# Altium footprint library CryptLib.PcbLib: 44 footprints (part 2 of 3)
Each footprint in its own frame and in the unit in brackets; x right, y up, seen from the top. Pads: shape width x height; smd on the part's side, far side on the other; paste and mask are expansions set on the pad; w line width, h text height; cw(c..) or ccw(c..) is an arc to the next point about the centre after c.
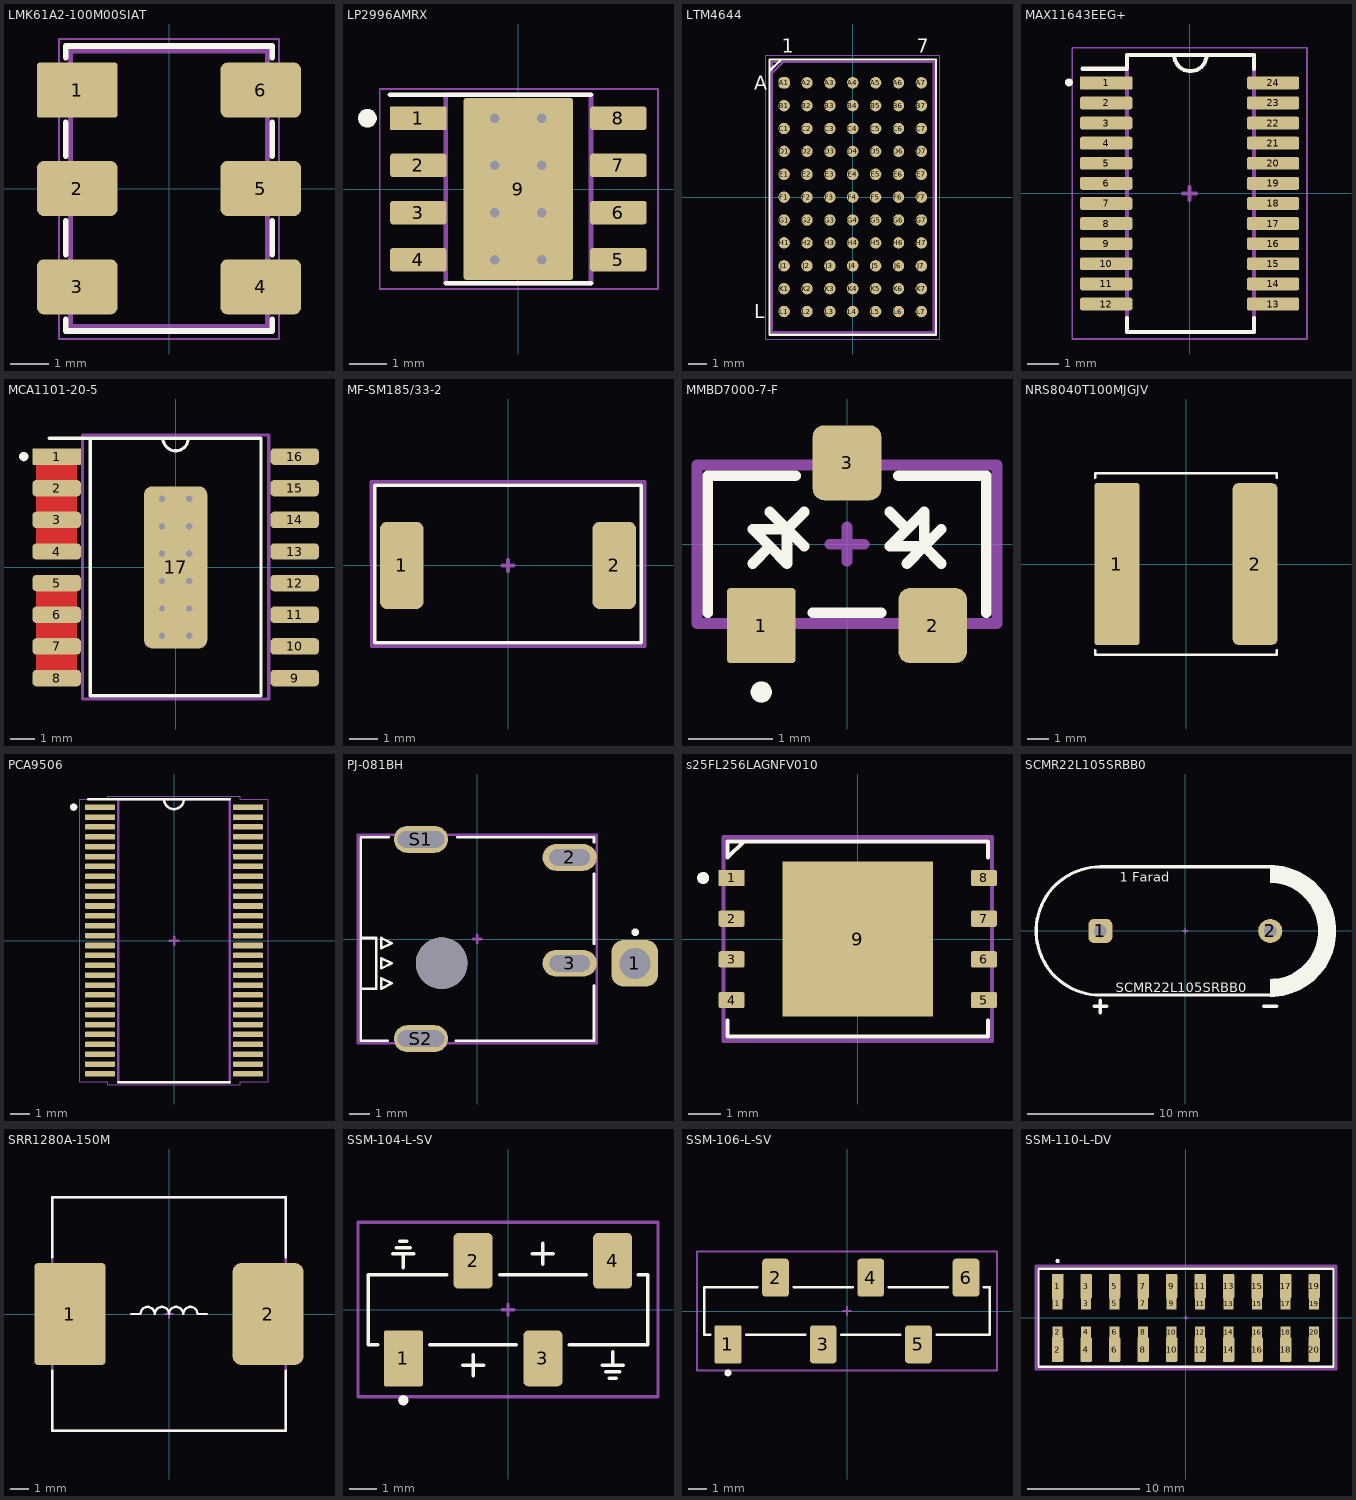
[diagram p1: the footprints below, top view; thin cyan lines are the x and y axes]

## LMK61A2-100M00SIAT [mil] "QFM-6 (7x5)"
height 45
pads (7):
  rrect10% 82x56 smd: 1(-93.33,100)
  rrect25% 82x56 smd: 2(-93.33,0) 3(-93.33,-100) 4(93.33,-100) 5(93.33,0) 6(93.33,100)
  round 7.5 on Mech8: ""(-93.33,100)
Top Overlay:
  lines w6: -105,-133 -105,-145 105,-145 105,-133 ; -105,-67 -105,-33 ; -105,33 -105,67 ; -105,133 -105,145 105,145 105,133 ; 105,-67 105,-33 ; 105,33 105,67
Top Designator:
  text "'.Designator'" at -113.3,-8.33 h20
Top Assembly:
  lines w5: -100,-140 -100,140 100,140 100,-140 -100,-140
Top Courtyard (Mech10):
  lines w2: -112,-153 -112,152 112,152 112,-153 -112,-153
3D body "SIA6_TEX.step": height 45.12, standoff 0, extent -100.51,-140 100.51,140

## LP2996AMRX [mil]
pads (11):
  rrect10% 60x25 smd: 1(-106,75)
  rrect25% 60x25 smd: 2(-106,25) 3(-106,-25) 4(-106,-75) 5(106,-75) 6(106,-25) 7(106,25) 8(106,75)
  rrect5% 116.14x192.91 smd paste-118.11 mask+0: 9(0,0)
  round 20 on Top Overlay: ""(-160,75)
  round 7.5 on Mech8: ""(-106,75)
via -25,25 diameter 20 hole 10
via -25,75 diameter 20 hole 10
via -25,-25 diameter 20 hole 10
via -25,-75 diameter 20 hole 10
via 25,-25 diameter 20 hole 10
via 25,-75 diameter 20 hole 10
via 25,25 diameter 20 hole 10
via 25,75 diameter 20 hole 10
Top Overlay:
  lines w5: -136,100 77,100 ; -77,-100 77,-100
Top Paste:
  region: 53.35,-66.93 -53.35,-66.93 -53.35,66.93 53.35,66.93
Top Designator:
  text "'.Designator'" at -113.3,-8.33 h20
Top Assembly:
  lines w5: -8,0 8,0 ; 0,-8 0,8 ; -77,-100 -77,100 77,100 77,-100 -77,-100
Top Courtyard (Mech10):
  lines w2: -147,-106 148,-106 148,106 -147,106 -147,-106
3D body "LP2996.STEP": height 67.43, standoff 0.5, extent -118.11,-96.46 118.11,96.45

## LTM4644 [mil] "77-BGA (15 x 9)"
height 200
pads (78):
  rrect75% 25x25 smd: A1(-150,250)
  round 25 smd: A2(-100,250) A3(-50,250) A4(0,250) A5(50,250) A6(100,250) A7(150,250) B1(-150,200) B2(-100,200) B3(-50,200) B4(0,200) B5(50,200) B6(100,200) B7(150,200) C1(-150,150) C2(-100,150) C3(-50,150) C4(0,150) C5(50,150) C6(100,150) C7(150,150) D1(-150,100) D2(-100,100) D3(-50,100) D4(0,100) D5(50,100) D6(100,100) D7(150,100) E1(-150,50) E2(-100,50) E3(-50,50) E4(0,50) E5(50,50) E6(100,50) E7(150,50) F1(-150,0) F2(-100,0) F3(-50,0) F4(0,0) F5(50,0) F6(100,0) F7(150,0) G1(-150,-50) G2(-100,-50) G3(-50,-50) G4(0,-50) G5(50,-50) G6(100,-50) G7(150,-50) H1(-150,-100) H2(-100,-100) H3(-50,-100) H4(0,-100) H5(50,-100) H6(100,-100) H7(150,-100) J1(-150,-150) J2(-100,-150) J3(-50,-150) J4(0,-150) J5(50,-150) J6(100,-150) J7(150,-150) K1(-150,-200) K2(-100,-200) K3(-50,-200) K4(0,-200) K5(50,-200) K6(100,-200) K7(150,-200) L1(-150,-250) L2(-100,-250) L3(-50,-250) L4(0,-250) L5(50,-250) L6(100,-250) L7(150,-250)
  round 7.5 on Mech8: ""(-150,250)
Top Overlay:
  lines w5: -182,275.5 -157,300.5 ; -182,-301 -182,301 182,301 182,-301 -182,-301
  text "7" at 140,315.63 h30
  text "1" at -155,315.63 h30
  text "A" at -215,235 h30
  text "L" at -215,-265 h30
Top Designator:
  text "'.Designator'" at -113.3,-8.33 h20
Top Assembly:
  lines w5: -177,270.5 -152,295.5 ; -8,0 8,0 ; 0,-8 0,8 ; -177,-295.5 -177,295.5 177,295.5 177,-295.5 -177,-295.5
Top Courtyard (Mech10):
  lines w2: -190,-310 190,-310 190,310 -190,310 -190,-310
3D body "User Library-LinearTech BGA77.STEP": height 200.53, standoff -1.05, extent -177.17,-295.28 177.17,295.28

## MAX11643EEG+ [mil] "SSOP-24"
pads (26):
  rrect10% 65x16 smd: 1(-103.74,137.5)
  rrect33% 65x16 smd: 2(-103.74,112.5) 3(-103.74,87.5) 4(-103.74,62.5) 5(-103.74,37.5) 6(-103.74,12.5) 7(-103.74,-12.5) 8(-103.74,-37.5) 9(-103.74,-62.5) 10(-103.74,-87.5) 11(-103.74,-112.5) 12(-103.74,-137.5) 13(103.74,-137.5) 14(103.74,-112.5) 15(103.74,-87.5) 16(103.74,-62.5) 17(103.74,-37.5) 18(103.74,-12.5) 19(103.74,12.5) 20(103.74,37.5) 21(103.74,62.5) 22(103.74,87.5) 23(103.74,112.5) 24(103.74,137.5)
  round 10 on Top Overlay: ""(-150,138)
  round 7.5 on Mech8: ""(-103.74,137.5)
Top Overlay:
  lines w5: -133,155 -78,155 -78,172 80,172 80,155 ; -78,-155 -78,-172 79,-172 ; -19,172 ccw(c1,172) 21,172 ; 80,-172 80,-155
Top Designator:
  text "'.Designator'" at -113.3,-8.33 h20
Top Assembly:
  lines w5: -8,0 8,0 ; 0,-8 0,8 ; -78,-172 -78,172 80,172 80,-172 -78,-172
Top Courtyard (Mech10):
  lines w2: -146,-181 -146,181 146,181 146,-181 -146,-181
3D body "MAX11643EEG+.STEP": height 69.4, standoff 0.5, extent -118.5,-170.28 118.5,170.28

## MCA1101-20-5 [mil] "SOIC-16 Current Sensor"
height 103.94
pads (19):
  rrect10% 77x26 smd: 1(-188,175)
  rrect50% 77x26 smd: 2(-188,125) 3(-188,75) 4(-188,25) 5(-188,-25) 6(-188,-75) 7(-188,-125) 8(-188,-175) 9(188,-175) 10(188,-125) 11(188,-75) 12(188,-25) 13(188,25) 14(188,75) 15(188,125) 16(188,175)
  rrect25% 100x256 smd: 17(0,0)
  round 15 on Top Overlay: ""(-240,175)
  round 7.5 on Mech8: ""(-188,175)
via -21.65,108.27 diameter 25 hole 10
via 21.65,108.27 diameter 25 hole 10
via -21.65,64.96 diameter 25 hole 10
via 21.65,64.96 diameter 25 hole 10
via -21.65,21.65 diameter 25 hole 10
via 21.65,21.65 diameter 25 hole 10
via -21.65,-21.65 diameter 25 hole 10
via 21.65,-21.65 diameter 25 hole 10
via -21.65,-64.96 diameter 25 hole 10
via 21.65,-64.96 diameter 25 hole 10
via -21.65,-108.27 diameter 25 hole 10
via 21.65,-108.27 diameter 25 hole 10
Top Layer:
  region: -220,182 -220,18 -156,18 -156,182
  region: -220,-18 -220,-182 -156,-182 -156,-18
Top Overlay:
  lines w5: -200,204 -135,204 ; -20,204 ccw(c0,204) 20,204 ; -135,204 -135,-203 135,-203 135,204 -135,204
Top Designator:
  text "'.Designator'" at -113.3,-8.33 h20
Top Assembly:
  lines w5: -8,0 8,0 ; 0,-8 0,8 ; -147,-208 147,-208 147,209 -147,209 -147,-208
3D body "MCA1101-20-5.step": height 103.94, standoff 0, extent -200.98,-202.76 200.98,202.76

## MF-SM185/33-2 [mil]
pads (3):
  rrect33% 60x120 smd: 1(-146,0) 2(146,0)
  round 7.5 on Mech8: ""(-146,0)
Top Overlay:
  lines w5: -183,-106 -183,-18 -183,110 183,110 183,-106 -183,-106
Top Designator:
  text "'.Designator'" at -113.3,-8.33 h20
Top Assembly:
  lines w5: -8,0 8,0 ; 0,-8 0,8 ; -188,115 188,115 188,-111 -187,-111 -188,115
3D body "User Library-SMD100F.step": height 119.19, standoff 1.08, extent -157.48,-98 157.48,98.85

## MMBD7000-7-F [mil]
pads (5):
  rrect10% 32x35 smd: 1(-40,-38)
  rrect33% 32x35 smd: 2(40,-38) 3(0,38)
  round 10 on Top Overlay: ""(-40,-69)
  round 7.5 on Mech8: ""(-40,-38)
Top Overlay:
  lines w5: -65,-32 -65,32 -24,32 ; -44,-9 -36,-1 ; -36,15 -28,7 ; -20,-1 -28,7 ; -20,15 -28,7 ; -16,-32 16,-32 ; 20,15 28,7 ; 24,32 65,32 65,-32 ; 28,-9 36,-1 ; 44,-9 36,-1 ; 44,7 36,-1 ; -36,-1 -44,7 -28,7 ; -36,-1 -28,-9 -28,7 ; 28,7 20,-1 36,-1 ; 28,7 36,15 36,-1
Top Designator:
  text "'.Designator'" at -113.3,-8.33 h20
Top Assembly:
  lines w5: -8,0 8,0 ; 0,-8 0,8 ; -70,-37 70,-37 70,37 -70,37 -70,-37
3D body "User Library-sot-3p290x130ll237h100.step": height 39.57, standoff 0, extent -57.09,-46.64 57.08,46.66

## NRS8040T100MJGJV [mil]
pads (3):
  rrect10% 83x300 smd: 1(-128,0)
  rrect25% 83x300 smd: 2(128,0)
  round 7.5 on Mech8: ""(-128,0)
Top Overlay:
  lines w5: -168,-160 -168,-168 168,-168 168,-160 ; -168,160 -168,168 168,168 168,160
Top Designator:
  text "'.Designator'" at -113.3,-8.33 h20
3D body "IND_NRS8040_TAY.step": height 165.12, standoff 0, extent -161.49,-161.49 161.5,161.5

## PCA9506 [mil] "TSSOP-56"
height 40
pads (58):
  rrect10% 60x11 smd: 1(-147.5,265.75)
  rrect33% 60x11 smd: 2(-147.5,246.06) 3(-147.5,226.38) 4(-147.5,206.69) 5(-147.5,187.01) 6(-147.5,167.32) 7(-147.5,147.64) 8(-147.5,127.95) 9(-147.5,108.27) 10(-147.5,88.58) 11(-147.5,68.9) 12(-147.5,49.21) 13(-147.5,29.53) 14(-147.5,9.84) 15(-147.5,-9.84) 16(-147.5,-29.53) 17(-147.5,-49.21) 18(-147.5,-68.9) 19(-147.5,-88.58) 20(-147.5,-108.27) 21(-147.5,-127.95) 22(-147.5,-147.64) 23(-147.5,-167.32) 24(-147.5,-187.01) 25(-147.5,-206.69) 26(-147.5,-226.38) 27(-147.5,-246.06) 28(-147.5,-265.75) 29(147.5,-265.75) 30(147.5,-246.06) 31(147.5,-226.38) 32(147.5,-206.69) 33(147.5,-187.01) 34(147.5,-167.32) 35(147.5,-147.64) 36(147.5,-127.95) 37(147.5,-108.27) 38(147.5,-88.58) 39(147.5,-68.9) 40(147.5,-49.21) 41(147.5,-29.53) 42(147.5,-9.84) 43(147.5,9.84) 44(147.5,29.53) 45(147.5,49.21) 46(147.5,68.9) 47(147.5,88.58) 48(147.5,108.27) 49(147.5,127.95) 50(147.5,147.64) 51(147.5,167.32) 52(147.5,187.01) 53(147.5,206.69) 54(147.5,226.38) 55(147.5,246.06) 56(147.5,265.75)
  round 15 on Top Overlay: ""(-200,266)
  round 7.5 on Mech8: ""(-147.5,265.75)
Top Overlay:
  lines w5: -171,282 110.79,282 ; -110.79,-282 110.79,-282 ; -20.1,282 ccw(c-0.1,282) 19.9,282
Top Designator:
  text "'.Designator'" at -113.3,-8.33 h20
Top Assembly:
  lines w5: -8,0 8,0 ; 0,-8 0,8 ; -111,-282 -111,282 111,282 111,-282 -111,-282
Top Courtyard (Mech10):
  lines w2: -187.5,-281.25 -132,-281.25 -132,-287.5 132,-287.5 132,-281.25 187.5,-281.25 187.5,281.25 132,281.25 132,287.5 -132,287.5 -132,281.25 -187.5,281.25 -187.5,-281.25
3D body "SOT364-1_NXP.step": height 47.09, standoff 0, extent -163.5,-277.48 163.5,277.48

## PJ-081BH [mil]
pads (8):
  rrect50% 90x90 hole 60: 1(305,-47)
  oval 105x52 hole 32 slot 78.74 at 0 deg: 2(179,158) 3(179,-47)
  oval 105x52 hole 32 slot 90.55 at 0 deg: S1(-109,193) S2(-109,-193)
  round 100 hole 100 unplated: ""(-69,-47)
  round 7.5 on Mech8: ""(305,-47)
  round 15 on Top Overlay: ""(306,13)
Top Overlay:
  lines w5: -226,-96 -196,-96 -196,2 -226,2 ; -173,-197 -226,-197 -226,197 -172,197 ; -42,-197 226,-197 226,-90 ; -39,197 226,197 226,187 ; 226,-9 226,126 ; -186,-96 -186,-76 -166,-86 -186,-96 ; -186,-57 -186,-37 -166,-47 -186,-57 ; -186,-18 -186,2 -166,-8 -186,-18
Top Designator:
  text "'.Designator'" at -113.3,-8.33 h20
Top Assembly:
  lines w5: -8,0 8,0 ; 0,-8 0,8 ; -231,-202 231,-202 231,202 -231,202 -231,-202
3D body "CUI_DEVICES_PJ-081BH.step": height 288.96, standoff -92.93, extent -225.18,-196.85 326,196.85

## s25FL256LAGNFV010 [mil]
pads (11):
  rrect10% 32x20 smd: 1(-155,75)
  rrect25% 32x20 smd: 2(-155,25) 3(-155,-25) 4(-155,-75) 5(155,-75) 6(155,-25) 7(155,25) 8(155,75)
  rect 185x190 smd: 9(0,0)
  round 15 on Top Overlay: ""(-190,75)
  round 7.5 on Mech8: ""(-155,75)
Top Overlay:
  lines w5: -160,-100 -160,-120 160,-120 160,-100 ; -140,120 -160,100 -160,120 160,120 160,100
Top Designator:
  text "'.Designator'" at -113.3,-8.33 h20
Top Assembly:
  lines w5: -8,0 8,0 ; 0,-8 0,8 ; -165,-125 165,-125 165,125 -165,125 -165,-125
3D body "W25Q256JVEIQ TR--3DModel-STEP-1.STEP": height 32, standoff 0.5, extent -157.48,-118.12 157.48,118.1

## SCMR22L105SRBB0 [mil]
pads (3):
  rrect50% 75x75 hole 40: 1(-265,0)
  round 75 hole 40: 2(265,0)
  round 7.5 on Mech8: ""(-265,0)
Top Overlay:
  region: 265,205 265,150 274.81,149.68 294.26,147.12 313.22,142.04 331.34,134.53 348.34,124.72 363.9,112.78 377.78,98.9 389.72,83.34 399.53,66.34 407.04,48.22 412.12,29.26 414.68,9.81 415,0 414.68,-9.81 412.12,-29.26 407.04,-48.22 399.53,-66.34 389.72,-83.33 377.78,-98.9 363.9,-112.78 348.34,-124.72 331.34,-134.53 313.22,-142.04 294.26,-147.12 274.81,-149.68 265,-150 265,-205 278.44,-205.02 305.1,-201.54 331.07,-194.6 355.91,-184.33 379.2,-170.9 400.53,-154.54 419.54,-135.53 435.9,-114.2 449.33,-90.91 459.6,-66.07 466.54,-40.1 470.02,-13.44 470,0 469.98,13.43 466.45,40.06 459.47,66 449.18,90.82 435.74,114.08 419.38,135.38 400.38,154.38 379.07,170.74 355.82,184.18 331,194.47 305.06,201.45 278.43,204.98
  lines w10: -285,-235 -245,-235 ; -265.5,-200 265.5,-200 ; -265.5,200 265.5,200 ; -265,-255 -265,-215 ; -265,-200 cw(c-265,0) -265,200 ; 245,-235 285,-235 ; 265,-200 ccw(c265,0) 265,200
  text "SCMR22L105SRBB0" at -217.43,-191 h30
  text "1 Farad" at -204.44,154 h30
Top Designator:
  text "'.Designator'" at -113.3,-8.33 h20
Top Assembly:
  lines w5: -265.5,-200 cw(c-265.5,0) -265.5,200 ; -265,-200 265,-200 ; -265,200 265,200 ; -8,0 8,0 ; 0,-8 0,8 ; 265.5,-200 ccw(c265.5,0) 265.5,200
3D body "SUPERCAP.STEP": height 871.64, standoff -742.53, extent -423.23,-157 423.23,157.96

## SRR1280A-150M [mil]
pads (3):
  rrect10% 150x215 smd: 1(-209,0)
  rrect25% 150x215 smd: 2(209,0)
  round 7.5 on Mech8: ""(-209,0)
Top Overlay:
  lines w5: -246,-120 -246,-246 246,-246 246,-120 ; -246,120 -246,246 246,246 246,120 ; -80,0 -60,0 cw(c-45,0) -30,0 cw(c-15,0) 0,0 cw(c15,0) 30,0 cw(c45,0) 60,0 80,0
Top Designator:
  text "'.Designator'" at -113.3,-8.33 h20
Top Assembly:
  lines w5: -8,0 8,0 ; 0,-8 0,8 ; -246,-246 246,-246 246,246 -246,246 -246,-246
3D body "SRR1280A.stp": height 308.07, standoff 0, extent -246.06,-246.06 246.07,246.07

## SSM-104-L-SV [mil]
pads (6):
  rrect10% 56x80 smd: 1(-150,-70)
  rrect25% 56x80 smd: 2(-50,70) 3(50,-70) 4(150,70)
  round 15 on Top Overlay: ""(-150,-130)
  round 7.5 on Mech8: ""(-150,-70)
Top Overlay:
  lines w5: -187,-50 -200,-50 -200,50 -88,50 ; -165,80 -135,80 ; -160,89 -140,89 ; -155,98 -145,98 ; -150,60 -150,80 ; -112,-50 12,-50 ; -65,-80 -35,-80 ; -50,-95 -50,-65 ; -12,50 112,50 ; 35,80 65,80 ; 50,65 50,95 ; 88,-50 200,-50 200,50 187,50 ; 135,-80 165,-80 ; 140,-89 160,-89 ; 145,-98 155,-98 ; 150,-80 150,-60
Top Designator:
  text "'.Designator'" at -113.3,-8.33 h20
Top Assembly:
  lines w5: -8,0 8,0 ; 0,-8 0,8 ; -215,-125 -215,125 215,125 215,-125 -215,-125
3D body "SSM-104-L-SV.stp": height 295.5, standoff 0.5, extent -200,-90 200,90

## SSM-106-L-SV [mil]
pads (8):
  rrect10% 56x80 smd: 1(-250,-70)
  rrect25% 56x80 smd: 2(-150,70) 3(-50,-70) 4(50,70) 5(150,-70) 6(250,70)
  round 15 on Top Overlay: ""(-250,-130)
  round 7.5 on Mech8: ""(-250,-70)
Top Overlay:
  lines w5: -287,-50 -300,-50 -300,50 -188,50 ; -212,-50 -88,-50 ; -112,50 12,50 ; -12,-50 112,-50 ; 88,50 212,50 ; 188,-50 300,-50 300,50 287,50
Top Designator:
  text "'.Designator'" at -113.3,-8.33 h20
Top Assembly:
  lines w5: -8,0 8,0 ; 0,-8 0,8 ; -315,-125 315,-125 315,125 -315,125 -315,-125
3D body "SSM-106-L-SV.stp": height 295.5, standoff 0.5, extent -300,-90 300,90

## SSM-110-L-DV [mil]
pads (42):
  rect 35x40 smd: 1(-450,50) 2(-450,-50) 3(-350,50) 4(-350,-50) 5(-250,50) 6(-250,-50) 7(-150,50) 8(-150,-50) 9(-50,50) 10(-50,-50) 11(50,50) 12(50,-50) 13(150,50) 14(150,-50) 15(250,50) 16(250,-50) 17(350,50) 18(350,-50) 19(450,50) 20(450,-50)
  rrect10% 40x88 smd: 1(-450,111)
  rrect25% 40x88 smd: 2(-450,-111) 3(-350,111) 4(-350,-111) 5(-250,111) 6(-250,-111) 7(-150,111) 8(-150,-111) 9(-50,111) 10(-50,-111) 11(50,111) 12(50,-111) 13(150,111) 14(150,-111) 15(250,111) 16(250,-111) 17(350,111) 18(350,-111) 19(450,111) 20(450,-111)
  round 7.5 on Mech8: ""(-450,111)
  round 15 on Top Overlay: ""(-450,200)
Top Overlay:
  lines w7.87: -517,-171 -517,173 518,173 518,-171 -517,-171
Top Designator:
  text "'.Designator'" at -113.3,-8.33 h20
Top Assembly:
  lines w5: -8,0 8,0 ; 0,-8 0,8
  lines w10: -525.81,-179.81 -525.81,182 527,182 527,-179.81 -525.81,-179.81
3D body "SSM-110-L-DV.stp": height 292.5, standoff 0.5, extent -500.01,-138.5 499.99,138.5